# Altium schematic symbol library IC_Maxim.SchLib: 843 symbols (part 3 of 20)
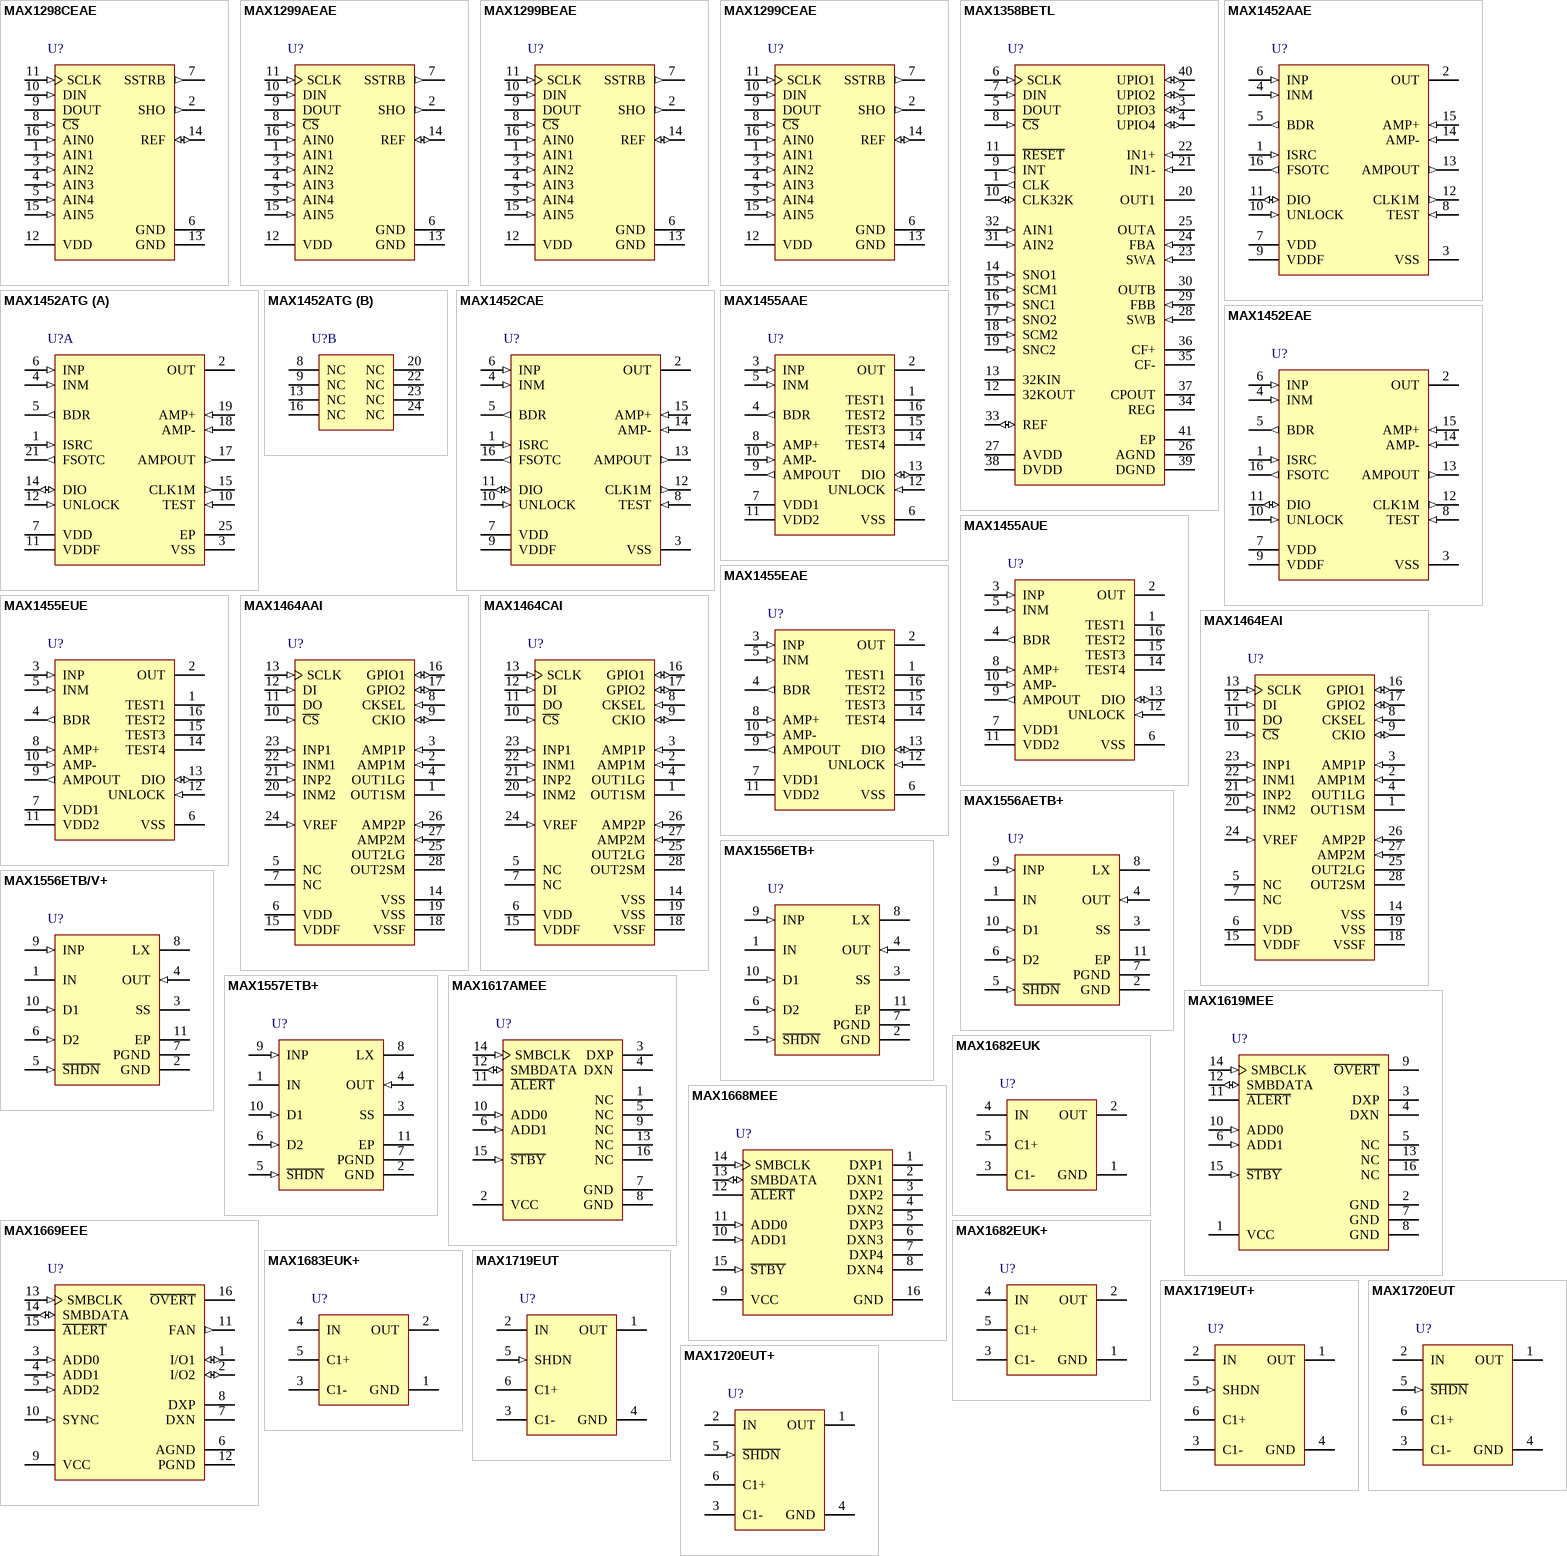
[diagram p26: symbols MAX1298CEAE to MAX1720EUT+]

## MAX1455AAE
designator U?
Low Cost Automotive Sensor Signal Conditioner with 16-bit DAC, -40 to 125 degC, 16-Pin SOP (A16-2); Generic Part Number: MAX1455; PartNumber: MAX1455AAE; Calibration Method: Internal DACs updated from internal EEPROM; Industry Qualified: Automotive - AECQ100, Automotive - General; Output Type: Analog; DatasheetVersion: Rev. 1; PackageVersion: Rev. C, 02/2010; PackageReference: A16-2; PackageDescription: 16-Pin Shrink Small-Outline Package, Body 5.29 x 6.2 mm, Pitch 0.65 mm; Supplier Part Number 1: MAX1455AAE-ND; Supplier Part Number 2: 700-MAX1455AAE-; DACs/ADCs: 16-bit DAC; Features: Aux. Op Amp, No External Trim Req'd ,Temp. Sensor; Mounting Technology: Surface Mount; ComponentLink1Description: Manufacturer URL; ComponentLink1URL: http://www.maximintegrated.com/; ComponentLink2Description: Datasheet; ComponentLink2URL: http://datasheets.maximintegrated.com/en/ds/MAX1455.pdf; ComponentLink3Description: Package Specification; ComponentLink3URL: http://pdfserv.maximintegrated.com/package_dwgs/21-0056.PDF
footprint SSOP16_0.65 (Footprint not found)
pins: 1 TEST1 "Test Pin. Connect to VSS or leave unconnected.", 2 OUT (hiz) "Analog Output. Internal voltage nodes can be accessed in digital mode. OUT can be parallel connected to DIO. Bypass OUT to ground with a 0.1uF capacitor to reduce output noise.", 3 INP (in) "Positive Input. Can be swapped to INM by the Configuration register.", 4 BDR (out) "Bridge Drive Output", 5 INM (in) "Negative Input. Can be swapped to INP by the Configuration register.", 6 VSS (power) "Negative Supply Voltage", 7 VDD1 (power) "Positive Supply Voltage 1. Connect a 0.1uF capacitor from VDD to VSS.", 8 AMP+ (in) "Auxiliary Op Amp Positive Input", 9 AMPOUT (out) "Auxiliary Op Amp Output", 10 AMP- (in) "Auxiliary Op Amp Negative Input", 11 VDD2 (power) "Positive Supply Voltage 2. Connect a 0.47uF capacitor from VDD2 to VSS. Connect VDD2 to VDD1 or for improved noise performance, connect a 1k ohm resistor to VDD1.", 12 UNLOCK (in) "Secure-Lock Disable. There is a 150uA pulldown to VSS. Connect to VDD to disable Secure-Lock and enable serial communication.", 13 DIO (io) "Digital Input Output. Single-pin serial communication port. There are no internal pullups on DIO. Connect pullup resistor from DIO to VDD when in digital mode.", 14 TEST4 "Test Pin. Do not connect.", 15 TEST3 "Test Pin. Connect to VSS or leave unconnected.", 16 TEST2 "Test Pin. Connect to VSS or leave unconnected."

## MAX1455AUE
designator U?
Low Cost Automotive Sensor Signal Conditioner with 16-bit DAC, -40 to 125 degC, 16-Pin SOP (U16-2); Generic Part Number: MAX1455; PartNumber: MAX1455AUE; Calibration Method: Internal DACs updated from internal EEPROM; Industry Qualified: Automotive - AECQ100, Automotive - General; Output Type: Analog; DatasheetVersion: Rev. 1; PackageVersion: Rev. L, 07/2010; PackageReference: U16-2; PackageDescription: 16-Pin Thin Shrink Small-Outline Package, Body 4.4 x 5 mm, Pitch 0.65 mm; Supplier Part Number 1: N/A; DACs/ADCs: 16-bit DAC; Features: Aux. Op Amp, No External Trim Req'd ,Temp. Sensor; Mounting Technology: Surface Mount; Code_JEDEC: MO-153; ComponentLink1Description: Manufacturer URL; ComponentLink1URL: http://www.maximintegrated.com/; ComponentLink2Description: Datasheet; ComponentLink2URL: http://datasheets.maximintegrated.com/en/ds/MAX1455.pdf; ComponentLink3Description: Package Specification; ComponentLink3URL: http://pdfserv.maximintegrated.com/package_dwgs/21-0066.PDF
footprint TSSOP16_0.65 (Footprint not found)
pins: 1 TEST1 "Test Pin. Connect to VSS or leave unconnected.", 2 OUT (hiz) "Analog Output. Internal voltage nodes can be accessed in digital mode. OUT can be parallel connected to DIO. Bypass OUT to ground with a 0.1uF capacitor to reduce output noise.", 3 INP (in) "Positive Input. Can be swapped to INM by the Configuration register.", 4 BDR (out) "Bridge Drive Output", 5 INM (in) "Negative Input. Can be swapped to INP by the Configuration register.", 6 VSS (power) "Negative Supply Voltage", 7 VDD1 (power) "Positive Supply Voltage 1. Connect a 0.1uF capacitor from VDD to VSS.", 8 AMP+ (in) "Auxiliary Op Amp Positive Input", 9 AMPOUT (out) "Auxiliary Op Amp Output", 10 AMP- (in) "Auxiliary Op Amp Negative Input", 11 VDD2 (power) "Positive Supply Voltage 2. Connect a 0.47uF capacitor from VDD2 to VSS. Connect VDD2 to VDD1 or for improved noise performance, connect a 1k ohm resistor to VDD1.", 12 UNLOCK (in) "Secure-Lock Disable. There is a 150uA pulldown to VSS. Connect to VDD to disable Secure-Lock and enable serial communication.", 13 DIO (io) "Digital Input Output. Single-pin serial communication port. There are no internal pullups on DIO. Connect pullup resistor from DIO to VDD when in digital mode.", 14 TEST4 "Test Pin. Do not connect.", 15 TEST3 "Test Pin. Connect to VSS or leave unconnected.", 16 TEST2 "Test Pin. Connect to VSS or leave unconnected."

## MAX1455EAE
designator U?
Low Cost Automotive Sensor Signal Conditioner with 16-bit DAC, -40 to 85 degC, 16-Pin SOP (A16-2); Generic Part Number: MAX1455; PartNumber: MAX1455EAE; Calibration Method: Internal DACs updated from internal EEPROM; Industry Qualified: Automotive - AECQ100, Automotive - General; Output Type: Analog; DatasheetVersion: Rev. 1; PackageVersion: Rev. C, 02/2010; PackageReference: A16-2; PackageDescription: 16-Pin Shrink Small-Outline Package, Body 5.29 x 6.2 mm, Pitch 0.65 mm; Supplier Part Number 1: MAX1455EAE-ND; Supplier Part Number 2: 700-MAX1455EAE-; DACs/ADCs: 16-bit DAC; Features: Aux. Op Amp, No External Trim Req'd ,Temp. Sensor; Mounting Technology: Surface Mount; ComponentLink1Description: Manufacturer URL; ComponentLink1URL: http://www.maximintegrated.com/; ComponentLink2Description: Datasheet; ComponentLink2URL: http://datasheets.maximintegrated.com/en/ds/MAX1455.pdf; ComponentLink3Description: Package Specification; ComponentLink3URL: http://pdfserv.maximintegrated.com/package_dwgs/21-0056.PDF
footprint SSOP16_0.65 (Footprint not found)
pins: 1 TEST1 "Test Pin. Connect to VSS or leave unconnected.", 2 OUT (hiz) "Analog Output. Internal voltage nodes can be accessed in digital mode. OUT can be parallel connected to DIO. Bypass OUT to ground with a 0.1uF capacitor to reduce output noise.", 3 INP (in) "Positive Input. Can be swapped to INM by the Configuration register.", 4 BDR (out) "Bridge Drive Output", 5 INM (in) "Negative Input. Can be swapped to INP by the Configuration register.", 6 VSS (power) "Negative Supply Voltage", 7 VDD1 (power) "Positive Supply Voltage 1. Connect a 0.1uF capacitor from VDD to VSS.", 8 AMP+ (in) "Auxiliary Op Amp Positive Input", 9 AMPOUT (out) "Auxiliary Op Amp Output", 10 AMP- (in) "Auxiliary Op Amp Negative Input", 11 VDD2 (power) "Positive Supply Voltage 2. Connect a 0.47uF capacitor from VDD2 to VSS. Connect VDD2 to VDD1 or for improved noise performance, connect a 1k ohm resistor to VDD1.", 12 UNLOCK (in) "Secure-Lock Disable. There is a 150uA pulldown to VSS. Connect to VDD to disable Secure-Lock and enable serial communication.", 13 DIO (io) "Digital Input Output. Single-pin serial communication port. There are no internal pullups on DIO. Connect pullup resistor from DIO to VDD when in digital mode.", 14 TEST4 "Test Pin. Do not connect.", 15 TEST3 "Test Pin. Connect to VSS or leave unconnected.", 16 TEST2 "Test Pin. Connect to VSS or leave unconnected."

## MAX1455EUE
designator U?
Low Cost Automotive Sensor Signal Conditioner with 16-bit DAC, -40 to 85 degC, 16-Pin SOP (U16-2); Generic Part Number: MAX1455; PartNumber: MAX1455EUE; Calibration Method: Internal DACs updated from internal EEPROM; Industry Qualified: Automotive - AECQ100, Automotive - General; Output Type: Analog; DatasheetVersion: Rev. 1; PackageVersion: Rev. L, 07/2010; PackageReference: U16-2; PackageDescription: 16-Pin Thin Shrink Small-Outline Package, Body 4.4 x 5 mm, Pitch 0.65 mm; Supplier Part Number 1: MAX1455EUE-ND; Supplier Part Number 2: 700-MAX1455EUE-; DACs/ADCs: 16-bit DAC; Features: Aux. Op Amp, No External Trim Req'd ,Temp. Sensor; Mounting Technology: Surface Mount; Code_JEDEC: MO-153; ComponentLink1Description: Manufacturer URL; ComponentLink1URL: http://www.maximintegrated.com/; ComponentLink2Description: Datasheet; ComponentLink2URL: http://datasheets.maximintegrated.com/en/ds/MAX1455.pdf; ComponentLink3Description: Package Specification; ComponentLink3URL: http://pdfserv.maximintegrated.com/package_dwgs/21-0066.PDF
footprint TSSOP16_0.65 (Footprint not found)
pins: 1 TEST1 "Test Pin. Connect to VSS or leave unconnected.", 2 OUT (hiz) "Analog Output. Internal voltage nodes can be accessed in digital mode. OUT can be parallel connected to DIO. Bypass OUT to ground with a 0.1uF capacitor to reduce output noise.", 3 INP (in) "Positive Input. Can be swapped to INM by the Configuration register.", 4 BDR (out) "Bridge Drive Output", 5 INM (in) "Negative Input. Can be swapped to INP by the Configuration register.", 6 VSS (power) "Negative Supply Voltage", 7 VDD1 (power) "Positive Supply Voltage 1. Connect a 0.1uF capacitor from VDD to VSS.", 8 AMP+ (in) "Auxiliary Op Amp Positive Input", 9 AMPOUT (out) "Auxiliary Op Amp Output", 10 AMP- (in) "Auxiliary Op Amp Negative Input", 11 VDD2 (power) "Positive Supply Voltage 2. Connect a 0.47uF capacitor from VDD2 to VSS. Connect VDD2 to VDD1 or for improved noise performance, connect a 1k ohm resistor to VDD1.", 12 UNLOCK (in) "Secure-Lock Disable. There is a 150uA pulldown to VSS. Connect to VDD to disable Secure-Lock and enable serial communication.", 13 DIO (io) "Digital Input Output. Single-pin serial communication port. There are no internal pullups on DIO. Connect pullup resistor from DIO to VDD when in digital mode.", 14 TEST4 "Test Pin. Do not connect.", 15 TEST3 "Test Pin. Connect to VSS or leave unconnected.", 16 TEST2 "Test Pin. Connect to VSS or leave unconnected."

## MAX1464AAI
designator U?
Low-Power, Low-Noise Multichannel Sensor Signal Processor with 16-bit ADC, 16-bit DAC, -40 to 125 degC, 28-Pin SOP (A28-1); Generic Part Number: MAX1464; PartNumber: MAX1464AAI; Calibration Method: Programmable 16-BIT CPU with on-board EEPROM; Industry Qualified: Automotive - AECQ100, Automotive - General; Interface: SPI; Microcontroller/CPU: CPU (16-bit, 4 MHz); Output Type: Analog, Digital ,PMW; DatasheetVersion: Rev. 0; PackageVersion: Rev. C, 02/2010; PackageReference: A28-1; PackageDescription: 28-Pin Shrink Small-Outline Package, Body 5.29 x 10.2 mm, Pitch 0.65 mm; Supplier Part Number 1: N/A; DACs/ADCs: 16-bit ADC, 16-bit DAC; Features: Calibration, Dual Channel ,Linearization and Temp. Compensation ,Low Cost ,Outputs configurable as independent signals ,Prog. Amplification ,Temp. Sensor; Mounting Technology: Surface Mount; Code_JEDEC: MO-150; ComponentLink1Description: Manufacturer URL; ComponentLink1URL: http://www.maximintegrated.com/; ComponentLink2Description: Datasheet; ComponentLink2URL: http://datasheets.maximintegrated.com/en/ds/MAX1464.pdf; ComponentLink3Description: Package Specification; ComponentLink3URL: http://pdfserv.maximintegrated.com/package_dwgs/21-0056.PDF
footprint SSOP28_0.65 (Footprint not found)
pins: 1 OUT1SM (hiz) "Small Op Amp 1 Output", 2 AMP1M (in) "Op Amp 1 Negative Input", 3 AMP1P (in) "Op Amp 1 Positive Input", 4 OUT1LG (hiz) "Large Op Amp 1 Output", 5 NC "No Connection", 6 VDD (power) "Positive Supply Voltage Input. Bypass VDD to VSS with a 0.1uF ceramic capacitor.", 7 NC "No Connection", 8 CKSEL (in) "Clock-Select Digital Input", 9 CKIO (io) "Clock Digital Input/Output", 10 ~{CS} (in) "SPI Chip-Select Digital Input. Active low.", 11 DO (hiz) "SPI Data Output", 12 DI (in) "SPI Data Input", 13 SCLK (in) "SPI Interface Clock", 14 VSS (power) "Negative Power-Supply Input", 15 VDDF (power) "Positive Supply Voltage for FLASH Memory. Bypass VDDF to VSS with a 0.1uF ceramic capacitor.", 16 GPIO1 (io) "General-Purpose Digital Input/Output 1", 17 GPIO2 (io) "General-Purpose Digital Input/Output 2", 18 VSSF (power) "Negative Power-Supply Input for FLASH Memory", 19 VSS (power) "Negative Power-Supply Input", 20 INM2 (in) "Negative Input for ADC Channel 2", 21 INP2 (in) "Positive Input for ADC Channel 2", 22 INM1 (in) "Negative Input for ADC Channel 1", 23 INP1 (in) "Positive Input for ADC Channel 1", 24 VREF (in) "External Reference Voltage Input for ADC and DACs", 25 OUT2LG (hiz) "Large Op Amp 2 Output", 26 AMP2P (in) "Op Amp 2 Positive Input", 27 AMP2M (in) "Op Amp 2 Negative Input", 28 OUT2SM (hiz) "Small Op Amp 2 Output"

## MAX1464CAI
designator U?
Low-Power, Low-Noise Multichannel Sensor Signal Processor with 16-bit ADC, 16-bit DAC, 0 to 70 degC, 28-Pin SOP (A28-1); Generic Part Number: MAX1464; PartNumber: MAX1464CAI; Calibration Method: Programmable 16-BIT CPU with on-board EEPROM; Industry Qualified: Automotive - AECQ100, Automotive - General; Interface: SPI; Microcontroller/CPU: CPU (16-bit, 4 MHz); Output Type: Analog, Digital ,PMW; DatasheetVersion: Rev. 0; PackageVersion: Rev. C, 02/2010; PackageReference: A28-1; PackageDescription: 28-Pin Shrink Small-Outline Package, Body 5.29 x 10.2 mm, Pitch 0.65 mm; Supplier Part Number 1: N/A; DACs/ADCs: 16-bit ADC, 16-bit DAC; Features: Calibration, Dual Channel ,Linearization and Temp. Compensation ,Low Cost ,Outputs configurable as independent signals ,Prog. Amplification ,Temp. Sensor; Mounting Technology: Surface Mount; Code_JEDEC: MO-150; ComponentLink1Description: Manufacturer URL; ComponentLink1URL: http://www.maximintegrated.com/; ComponentLink2Description: Datasheet; ComponentLink2URL: http://datasheets.maximintegrated.com/en/ds/MAX1464.pdf; ComponentLink3Description: Package Specification; ComponentLink3URL: http://pdfserv.maximintegrated.com/package_dwgs/21-0056.PDF
footprint SSOP28_0.65 (Footprint not found)
pins: 1 OUT1SM (hiz) "Small Op Amp 1 Output", 2 AMP1M (in) "Op Amp 1 Negative Input", 3 AMP1P (in) "Op Amp 1 Positive Input", 4 OUT1LG (hiz) "Large Op Amp 1 Output", 5 NC "No Connection", 6 VDD (power) "Positive Supply Voltage Input. Bypass VDD to VSS with a 0.1uF ceramic capacitor.", 7 NC "No Connection", 8 CKSEL (in) "Clock-Select Digital Input", 9 CKIO (io) "Clock Digital Input/Output", 10 ~{CS} (in) "SPI Chip-Select Digital Input. Active low.", 11 DO (hiz) "SPI Data Output", 12 DI (in) "SPI Data Input", 13 SCLK (in) "SPI Interface Clock", 14 VSS (power) "Negative Power-Supply Input", 15 VDDF (power) "Positive Supply Voltage for FLASH Memory. Bypass VDDF to VSS with a 0.1uF ceramic capacitor.", 16 GPIO1 (io) "General-Purpose Digital Input/Output 1", 17 GPIO2 (io) "General-Purpose Digital Input/Output 2", 18 VSSF (power) "Negative Power-Supply Input for FLASH Memory", 19 VSS (power) "Negative Power-Supply Input", 20 INM2 (in) "Negative Input for ADC Channel 2", 21 INP2 (in) "Positive Input for ADC Channel 2", 22 INM1 (in) "Negative Input for ADC Channel 1", 23 INP1 (in) "Positive Input for ADC Channel 1", 24 VREF (in) "External Reference Voltage Input for ADC and DACs", 25 OUT2LG (hiz) "Large Op Amp 2 Output", 26 AMP2P (in) "Op Amp 2 Positive Input", 27 AMP2M (in) "Op Amp 2 Negative Input", 28 OUT2SM (hiz) "Small Op Amp 2 Output"

## MAX1464EAI
designator U?
Low-Power, Low-Noise Multichannel Sensor Signal Processor with 16-bit ADC, 16-bit DAC, -40 to 85 degC, 28-Pin SOP (A28-1); Generic Part Number: MAX1464; PartNumber: MAX1464EAI; Calibration Method: Programmable 16-BIT CPU with on-board EEPROM; Industry Qualified: Automotive - AECQ100, Automotive - General; Interface: SPI; Microcontroller/CPU: CPU (16-bit, 4 MHz); Output Type: Analog, Digital ,PMW; DatasheetVersion: Rev. 0; PackageVersion: Rev. C, 02/2010; PackageReference: A28-1; PackageDescription: 28-Pin Shrink Small-Outline Package, Body 5.29 x 10.2 mm, Pitch 0.65 mm; Supplier Part Number 1: N/A; DACs/ADCs: 16-bit ADC, 16-bit DAC; Features: Calibration, Dual Channel ,Linearization and Temp. Compensation ,Low Cost ,Outputs configurable as independent signals ,Prog. Amplification ,Temp. Sensor; Mounting Technology: Surface Mount; Code_JEDEC: MO-150; ComponentLink1Description: Manufacturer URL; ComponentLink1URL: http://www.maximintegrated.com/; ComponentLink2Description: Datasheet; ComponentLink2URL: http://datasheets.maximintegrated.com/en/ds/MAX1464.pdf; ComponentLink3Description: Package Specification; ComponentLink3URL: http://pdfserv.maximintegrated.com/package_dwgs/21-0056.PDF
footprint SSOP28_0.65 (Footprint not found)
pins: 1 OUT1SM (hiz) "Small Op Amp 1 Output", 2 AMP1M (in) "Op Amp 1 Negative Input", 3 AMP1P (in) "Op Amp 1 Positive Input", 4 OUT1LG (hiz) "Large Op Amp 1 Output", 5 NC "No Connection", 6 VDD (power) "Positive Supply Voltage Input. Bypass VDD to VSS with a 0.1uF ceramic capacitor.", 7 NC "No Connection", 8 CKSEL (in) "Clock-Select Digital Input", 9 CKIO (io) "Clock Digital Input/Output", 10 ~{CS} (in) "SPI Chip-Select Digital Input. Active low.", 11 DO (hiz) "SPI Data Output", 12 DI (in) "SPI Data Input", 13 SCLK (in) "SPI Interface Clock", 14 VSS (power) "Negative Power-Supply Input", 15 VDDF (power) "Positive Supply Voltage for FLASH Memory. Bypass VDDF to VSS with a 0.1uF ceramic capacitor.", 16 GPIO1 (io) "General-Purpose Digital Input/Output 1", 17 GPIO2 (io) "General-Purpose Digital Input/Output 2", 18 VSSF (power) "Negative Power-Supply Input for FLASH Memory", 19 VSS (power) "Negative Power-Supply Input", 20 INM2 (in) "Negative Input for ADC Channel 2", 21 INP2 (in) "Positive Input for ADC Channel 2", 22 INM1 (in) "Negative Input for ADC Channel 1", 23 INP1 (in) "Positive Input for ADC Channel 1", 24 VREF (in) "External Reference Voltage Input for ADC and DACs", 25 OUT2LG (hiz) "Large Op Amp 2 Output", 26 AMP2P (in) "Op Amp 2 Positive Input", 27 AMP2M (in) "Op Amp 2 Negative Input", 28 OUT2SM (hiz) "Small Op Amp 2 Output"

## MAX1556AETB+
designator U?
16uA IQ, 1.2A PWM Step-Down DC-DC Converter, 1.8V; 2.5V; 3.3V output, 10-Pin TDFN-EP, -40癈 to +85癈, Pb-Free; DatasheetVersion: Rev 3, Jan-2011; PackageVersion: revJ, 2009; PackageReference: T1033+1; PackageDescription: 10-Pin Plastic Very Very Thin Dual Flatpack No Leads, Exposed Pad, 3 x 3 x 0.8 mm Body, TDFN-EP, Pb-Free; Code_JEDEC: MO-229-WEED-3; ComponentLink1Description: Manufacturer URL; ComponentLink1URL: http://www.maxim-ic.com; ComponentLink2Description: Datasheet; ComponentLink2URL: http://datasheets.maxim-ic.com/en/ds/MAX1556-MAX1557.pdf; ComponentLink3Description: Package Specification; ComponentLink3URL: http://pdfserv.maxim-ic.com/package_dwgs/21-0137.PDF
footprint DFN10_0.5-PAD(3X3) (Footprint not found)
pins: 1 IN (power), 2 GND (power), 3 SS, 4 OUT (in), 5 ~{SHDN} (in), 6 D2 (in), 7 PGND (power), 8 LX, 9 INP (in), 10 D1 (in), 11 EP (power)

## MAX1556ETB+
designator U?
16uA IQ, 1.2A PWM Step-Down DC-DC Converter, 1.8V; 2.5V; 3.3V output, 10-Pin TDFN-EP, -40癈 to +85癈, Pb-Free; DatasheetVersion: Rev 3, Jan-2011; PackageVersion: revJ, 2009; PackageReference: T1033+1; PackageDescription: 10-Pin Plastic Very Very Thin Dual Flatpack No Leads, Exposed Pad, 3 x 3 x 0.8 mm Body, TDFN-EP, Pb-Free; Code_JEDEC: MO-229-WEED-3; ComponentLink1Description: Manufacturer URL; ComponentLink1URL: http://www.maxim-ic.com; ComponentLink2Description: Datasheet; ComponentLink2URL: http://datasheets.maxim-ic.com/en/ds/MAX1556-MAX1557.pdf; ComponentLink3Description: Package Specification; ComponentLink3URL: http://pdfserv.maxim-ic.com/package_dwgs/21-0137.PDF
footprint DFN10_0.5-PAD(3X3) (Footprint not found)
pins: 1 IN (power), 2 GND (power), 3 SS, 4 OUT (in), 5 ~{SHDN} (in), 6 D2 (in), 7 PGND (power), 8 LX, 9 INP (in), 10 D1 (in), 11 EP (power)

## MAX1556ETB/V+
designator U?
16uA IQ, 1.2A PWM Step-Down DC-DC Converter, 1.8V; 2.5V; 3.3V output, 10-Pin TDFN-EP, -40癈 to +85癈, Pb-Free; DatasheetVersion: Rev 3, Jan-2011; PackageVersion: revJ, 2009; PackageReference: T1033+1; PackageDescription: 10-Pin Plastic Very Very Thin Dual Flatpack No Leads, Exposed Pad, 3 x 3 x 0.8 mm Body, TDFN-EP, Pb-Free; Code_JEDEC: MO-229-WEED-3; ComponentLink1Description: Manufacturer URL; ComponentLink1URL: http://www.maxim-ic.com; ComponentLink2Description: Datasheet; ComponentLink2URL: http://datasheets.maxim-ic.com/en/ds/MAX1556-MAX1557.pdf; ComponentLink3Description: Package Specification; ComponentLink3URL: http://pdfserv.maxim-ic.com/package_dwgs/21-0137.PDF
footprint DFN10_0.5-PAD(3X3) (Footprint not found)
pins: 1 IN (power), 2 GND (power), 3 SS, 4 OUT (in), 5 ~{SHDN} (in), 6 D2 (in), 7 PGND (power), 8 LX, 9 INP (in), 10 D1 (in), 11 EP (power)

## MAX1557ETB+
designator U?
16uA IQ, 1.2A PWM Step-Down DC-DC Converter, 1V; 1.3V; 1.5V output, 10-Pin TDFN-EP, -40癈 to +85癈, Pb-Free; DatasheetVersion: Rev 3, Jan-2011; PackageVersion: revJ, 2009; PackageReference: T1033+1; PackageDescription: 10-Pin Plastic Very Very Thin Dual Flatpack No Leads, Exposed Pad, 3 x 3 x 0.8 mm Body, TDFN-EP, Pb-Free; Code_JEDEC: MO-229-WEED-3; ComponentLink1Description: Manufacturer URL; ComponentLink1URL: http://www.maxim-ic.com; ComponentLink2Description: Datasheet; ComponentLink2URL: http://datasheets.maxim-ic.com/en/ds/MAX1556-MAX1557.pdf; ComponentLink3Description: Package Specification; ComponentLink3URL: http://pdfserv.maxim-ic.com/package_dwgs/21-0137.PDF
footprint DFN10_0.5-PAD(3X3) (Footprint not found)
pins: 1 IN (power), 2 GND (power), 3 SS, 4 OUT (in), 5 ~{SHDN} (in), 6 D2 (in), 7 PGND (power), 8 LX, 9 INP (in), 10 D1 (in), 11 EP (power)

## MAX1617AMEE
designator U?
Remote / Local Temperature Sensor with SMBus Serial Interface, 8 Bits Temperature Resolution, -55 to 125 degC, 16-Pin SOP (E16-1); Generic Part Number: MAX1617A; PartNumber: MAX1617AMEE; Alarm Output: Alert; Functions: Remote & Local Sensor; Interface: 2-Wire/I2C/SMBus; Parasite Pwr.: No; DatasheetVersion: Rev. 1; PackageVersion: Rev. K, 04/2012; PackageReference: E16-1; PackageDescription: 16-Pin Quarter Small-Outline Package (E16-1), Body 4.90 x 3.89 mm, Pitch 0.635 mm; Supplier Part Number 1: MAX1617AMEE-ND; Supplier Part Number 2: N/A; Mounting Technology: Surface Mount; Code_JEDEC: MO137; ComponentLink1Description: Manufacturer URL; ComponentLink1URL: http://www.maximintegrated.com/; ComponentLink2Description: Datasheet; ComponentLink2URL: http://datasheets.maximintegrated.com/en/ds/MAX1617A.pdf; ComponentLink3Description: Package Specification; ComponentLink3URL: http://pdfserv.maximintegrated.com/package_dwgs/21-0055.PDF
footprint SSOP16_0.635 (Footprint not found)
pins: 1 NC "No Connection. Not internally connected. May be used for PC board trace routing.", 2 VCC (power) "Supply Voltage Input. +3.0V to +5.5V. Bypass to GND with a 0.1uF capacitor. A 200ohm series resistor is recommended but not required for additional noise filtering.", 3 DXP "Combined Current Source and ADC Positive Input for Remote-Junction Channel. If a remotesensing junction is not used, connect DXP to DXN.", 4 DXN "Combined Current Sink and ADC Negative Input. DXN is internally biased to a diode voltage above ground.", 5 NC "No Connection. Not internally connected. May be used for PC board trace routing.", 6 ADD1 (in) "SMBus Slave Address Select Input. ADD0 and ADD1 are sampled upon power-up.", 7 GND (power) "Ground", 8 GND (power) "Ground", 9 NC "No Connection. Not internally connected. May be used for PC board trace routing.", 10 ADD0 (in) "SMBus Slave Address Select Input. ADD0 and ADD1 are sampled upon power-up.", 11 ~{ALERT} (oc) "SMBus Alert (Interrupt) Output. Open drain.", 12 SMBDATA (io) "SMBus Serial-Data Input/Output. Open drain.", 13 NC "No Connection. Not internally connected. May be used for PC board trace routing.", 14 SMBCLK (in) "SMBus Serial-Clock Input", 15 ~{STBY} (in) "Hardware Standby Input. Temperature and comparison threshold data are retained in standby mode. Low = standby mode, high = operating mode.", 16 NC "No Connection. Not internally connected. May be used for PC board trace routing."

## MAX1619MEE
designator U?
Remote / Local Temperature Sensor with Dual-Alarm Outputs and SMBus Serial Interface, 8 Bits Temperature Resolution, -55 to 125 degC, 16-Pin SOP (E16-5); Generic Part Number: MAX1619; PartNumber: MAX1619MEE; Alarm Output: Alert, Overt; Functions: Remote & Local Sensor; Interface: 2-Wire/I2C/SMBus; Parasite Pwr.: No; DatasheetVersion: Rev. 0; PackageVersion: Rev. K, 04/2012; PackageReference: E16-5; PackageDescription: 16-Pin Quarter Small-Outline Package, Body 3.9 x 4.89 mm, Pitch 0.635 mm; Supplier Part Number 1: MAX1619MEE-ND; Supplier Part Number 2: N/A; Mounting Technology: Surface Mount; Code_JEDEC: MO-137; ComponentLink1Description: Manufacturer URL; ComponentLink1URL: http://www.maximintegrated.com/; ComponentLink2Description: Datasheet; ComponentLink2URL: http://datasheets.maximintegrated.com/en/ds/MAX1619.pdf; ComponentLink3Description: Package Specification; ComponentLink3URL: http://pdfserv.maximintegrated.com/package_dwgs/21-0055.PDF
footprint SSOP16_0.635 (Footprint not found)
pins: 1 VCC (power) "Supply Voltage Input, 3V to 5.5V. Bypass to GND with a 0.1uF capacitor. A 200Ohm series resistor is recommended but not required for additional noise filtering.", 2 GND (power) "Not internally connected. Connect to GND to act against leakage paths from VCC to DXP.", 3 DXP "Combined Current Source and A/D Positive Input for Remote-Diode Channel. Do not leave DXP floating; connect DXP to DXN if no remote diode is used. Place a 2200pF capacitor between DXP and DXN for noise filtering.", 4 DXN "Combined Current Sink and A/D Negative Input. DXN is normally internally biased to a diode voltage above ground.", 5 NC "No Connection. Not internally connected. May be used for PC board trace routing.", 6 ADD1 (in) "SMBus Address Select Pin (Table 8). ADD0 and ADD1 are sampled upon power-up. Excess capacitance (>50pF) at the address pins when floating may cause address-recognition problems.", 7 GND (power) "Ground", 8 GND (power) "Ground", 9 ~{OVERT} (oc) "Overtemperature Alarm Output, Open Drain. This is an unlatched alarm output that responds only to the remote diode temperature.", 10 ADD0 (in) "SMBus Slave Address Select Pin", 11 ~{ALERT} (oc) "SMBus Alert (interrupt) Output, Open Drain", 12 SMBDATA (io) "SMBus Serial-Data Input/Output, Open Drain", 13 NC "No Connection. Not internally connected. May be used for PC board trace routing.", 14 SMBCLK (in) "SMBus Serial-Clock Input", 15 ~{STBY} (in) "Hardware Standby Input. Temperature and comparison threshold data are retained in standby mode.Low = standby mode, high = operate mode.", 16 NC "No Connection. Not internally connected. May be used for PC board trace routing."

## MAX1668MEE
designator U?
Five-Channel Temperature Sensor with SMBus Serial Interface, 8 Bits Temperature Resolution, -55 to 125 degC, 16-Pin SOP (E16-1); Generic Part Number: MAX1668; PartNumber: MAX1668MEE; Alarm Output: Alert; Functions: Remote & Local Sensor; Interface: 2-Wire/I2C/SMBus; Parasite Pwr.: No; DatasheetVersion: Rev. 2; PackageVersion: Rev. K, 04/2012; PackageReference: E16-1; PackageDescription: 16-Pin Quarter Small-Outline Package (E16-1), Body 4.90 x 3.89 mm, Pitch 0.635 mm; Supplier Part Number 1: MAX1668MEE-ND; Supplier Part Number 2: N/A; Mounting Technology: Surface Mount; Code_JEDEC: MO137; ComponentLink1Description: Manufacturer URL; ComponentLink1URL: http://www.maximintegrated.com/; ComponentLink2Description: Datasheet; ComponentLink2URL: http://datasheets.maximintegrated.com/en/ds/MAX1668-MAX1989.pdf; ComponentLink3Description: Package Specification; ComponentLink3URL: http://pdfserv.maximintegrated.com/package_dwgs/21-0055.PDF
footprint SSOP16_0.635 (Footprint not found)
pins: 1 DXP1 "Combined Current Source and A/D Positive Input for Remote-Diode Channel. Do not leave DXP floating; connect DXP to DXN if no remote diode is used. Place a 2200pF capacitor between DXP and DXN for noise filtering.", 2 DXN1 "Combined Current Sink and A/D Negative Input. DXN is normally biased to a diode voltage above ground.", 3 DXP2 "Combined Current Source and A/D Positive Input for Remote-Diode Channel. Do not leave DXP floating; connect DXP to DXN if no remote diode is used. Place a 2200pF capacitor between DXP and DXN for noise filtering.", 4 DXN2 "Combined Current Sink and A/D Negative Input. DXN is normally biased to a diode voltage above ground.", 5 DXP3 "Combined Current Source and A/D Positive Input for Remote-Diode Channel. Do not leave DXP floating; connect DXP to DXN if no remote diode is used. Place a 2200pF capacitor between DXP and DXN for noise filtering.", 6 DXN3 "Combined Current Sink and A/D Negative Input. DXN is normally biased to a diode voltage above ground.", 7 DXP4 "Combined Current Source and A/D Positive Input for Remote-Diode Channel. Do not leave DXP floating; connect DXP to DXN if no remote diode is used. Place a 2200pF capacitor between DXP and DXN for noise filtering.", 8 DXN4 "Combined Current Sink and A/D Negative Input. DXN is normally biased to a diode voltage above ground.", 9 VCC (power) "Supply Voltage Input, 3V to 5.5V. Bypass to GND with a 0.1礔 capacitor. A 200ohm series resistor is recommended but not required for additional noise filtering.", 10 ADD1 (in) "SMBus Address Select Pin (Table 8). ADD0 and ADD1 are sampled upon power-up. Excess capacitance (>50pF) at the address pins when floating can cause addressrecognition problems.", 11 ADD0 (in) "SMBus Slave Address Select Pin", 12 ~{ALERT} (oc) "SMBus Alert (Interrupt) Output, Open Drain", 13 SMBDATA (io) "SMBus Serial-Data Input/Output, Open Drain", 14 SMBCLK (in) "SMBus Serial-Clock Input", 15 ~{STBY} (in) "Hardware Standby Input. Temperature and comparison threshold data are retained in standby mode. Low = standby mode, high = operate mode.", 16 GND (power) "Ground"

## MAX1669EEE
designator U?
Remote Temperature Sensor and Fan Controller with SMBus Serial Interface, 8 Bits Tempearture Resolution, -40 to 85 degC, 16-Pin SOP (E16-1); Generic Part Number: MAX1669; PartNumber: MAX1669EEE; Fan Cntrl.: PWM; Interface: 2-Wire/I2C/SMBus; DatasheetVersion: Rev. 0; PackageVersion: Rev. K, 04/2012; PackageReference: E16-1; PackageDescription: 16-Pin Quarter Small-Outline Package (E16-1), Body 4.90 x 3.89 mm, Pitch 0.635 mm; Supplier Part Number 1: N/A; Mounting Technology: Surface Mount; Code_JEDEC: MO137; ComponentLink1Description: Manufacturer URL; ComponentLink1URL: http://www.maximintegrated.com/; ComponentLink2Description: Datasheet; ComponentLink2URL: http://datasheets.maximintegrated.com/en/ds/MAX1669.pdf; ComponentLink3Description: Package Specification; ComponentLink3URL: http://pdfserv.maximintegrated.com/package_dwgs/21-0055.PDF
footprint SSOP16_0.635 (Footprint not found)
pins: 1 I/O1 (io) "General-Purpose Open-Drain Logic Input/Output 1. I/O1 is intended for driving LEDs, driving power-plane switching MOSFETs, or detecting fan presence or chassis intrusion.", 2 I/O2 (io) "General-Purpose Open-Drain Logic Input/Output 2. I/O2 is intended for driving LEDs, driving power-plane switching MOSFETs, or detecting fan presence or chassis intrusion.", 3 ADD0 (in) "SMBus Address Select Pin 0.", 4 ADD1 (in) "SMBus Address Select Pin 1.", 5 ADD2 (in) "SMBus Address Select Pin 2.", 6 AGND (power) "Analog Ground", 7 DXN "Combined Current Sink and ADC Negative Input from Remote Diode. DXN is normally biased to a diode voltage above ground.", 8 DXP "Combined Current Source and ADC Positive Input from Remote Diode. Place a 2200pF capacitor between DXP and DXN for noise filtering.", 9 VCC (power) "Supply Voltage Input, +3V to +5.5V. Bypass to AGND with a 0.1uF capacitor.", 10 SYNC (in) "Oscillator Synchronization Input. Connect to AGND to use internal clock. Capture range is 140kHz to 400kHz. The synchronization signal is internally applied to the FAN PWM clock. See Table 5 for synchronized frequencies.", 11 FAN (out) "Fan-Control Logic Output. Swings from PGND to VCC in PWM mode, or PGND to 0.94 ?VCC in DAC mode.", 12 PGND (power) "Power Ground", 13 SMBCLK (in) "SMBus Serial-Clock Input", 14 SMBDATA (io) "Open-Drain SMBus Serial-Data Input/Output", 15 ~{ALERT} (hiz) "Active-Low, Open-Drain SMBus Alert (interrupt) Output", 16 ~{OVERT} (hiz) "Active-Low, Open-Drain Thermostat Output. Activated by TCRIT threshold"

## MAX1682EUK
designator U?
Switched-Capacitor Voltage Doubler, 12kHz Oscillator, 5-Pin SOT, -40癈 to +85癈; DatasheetVersion: Rev 3, Nov-2010; PackageVersion: revF, 2006; PackageReference: U5-2; PackageDescription: 5-Pin Small-Outline Transistor Package, 0.95 mm Pitch, 2.8 mm Lead Span, SOT-23; Code_JEDEC: MO-178AA; ComponentLink1Description: Manufacturer URL; ComponentLink1URL: http://www.maxim-ic.com; ComponentLink2Description: Datasheet; ComponentLink2URL: http://datasheets.maxim-ic.com/en/ds/MAX1682-MAX1683.pdf; ComponentLink3Description: Package Specification; ComponentLink3URL: http://pdfserv.maxim-ic.com/package_dwgs/21-0057.PDF
footprint SOT23-5 (Footprint not found)
pins: 1 GND (power), 2 OUT (power), 3 C1-, 4 IN (power), 5 C1+

## MAX1682EUK+
designator U?
Switched-Capacitor Voltage Doubler, 12kHz Oscillator, 5-Pin SOT, -40癈 to +85癈, Pb-Free; DatasheetVersion: Rev 3, Nov-2010; PackageVersion: revF, 2006; PackageReference: U5+2; PackageDescription: 5-Pin Small-Outline Transistor Package, 0.95 mm Pitch, 2.8 mm Lead Span, SOT-23, Pb-Free; Code_JEDEC: MO-178AA; ComponentLink1Description: Manufacturer URL; ComponentLink1URL: http://www.maxim-ic.com; ComponentLink2Description: Datasheet; ComponentLink2URL: http://datasheets.maxim-ic.com/en/ds/MAX1682-MAX1683.pdf; ComponentLink3Description: Package Specification; ComponentLink3URL: http://pdfserv.maxim-ic.com/package_dwgs/21-0057.PDF
footprint SOT23-5 (Footprint not found)
pins: 1 GND (power), 2 OUT (power), 3 C1-, 4 IN (power), 5 C1+

## MAX1683EUK+
designator U?
Switched-Capacitor Voltage Doubler, 35kHz Oscillator, 5-Pin SOT, -40癈 to +85癈, Pb-Free; DatasheetVersion: Rev 3, Nov-2010; PackageVersion: revF, 2006; PackageReference: U5+2; PackageDescription: 5-Pin Small-Outline Transistor Package, 0.95 mm Pitch, 2.8 mm Lead Span, SOT-23, Pb-Free; Code_JEDEC: MO-178AA; ComponentLink1Description: Manufacturer URL; ComponentLink1URL: http://www.maxim-ic.com; ComponentLink2Description: Datasheet; ComponentLink2URL: http://datasheets.maxim-ic.com/en/ds/MAX1682-MAX1683.pdf; ComponentLink3Description: Package Specification; ComponentLink3URL: http://pdfserv.maxim-ic.com/package_dwgs/21-0057.PDF
footprint SOT23-5 (Footprint not found)
pins: 1 GND (power), 2 OUT (power), 3 C1-, 4 IN (power), 5 C1+

## MAX1719EUT
designator U?
Switched-Capacitor Voltage Inverter with Shutdown, 125kHz, 6-Pin SOT, -40癈 to +85癈; DatasheetVersion: Rev 2, Apr-2004; PackageVersion: revL, 2011; PackageReference: U6-4; PackageDescription: 6-Pin SOT-23 Package, 0.65 mm Pitch, 2.2 mm Lead Span; Code_JEDEC: MO-178-AB; ComponentLink1Description: Manufacturer URL; ComponentLink1URL: http://www.maxim-ic.com; ComponentLink2Description: Datasheet; ComponentLink2URL: http://datasheets.maxim-ic.com/en/ds/MAX1719-MAX1721.pdf; ComponentLink3Description: Package Specification; ComponentLink3URL: http://pdfserv.maxim-ic.com/package_dwgs/21-0058.PDF
footprint SOT23-6 (Footprint not found)
pins: 1 OUT (power), 2 IN (power), 3 C1-, 4 GND (power), 5 SHDN (in), 6 C1+

## MAX1719EUT+
designator U?
Switched-Capacitor Voltage Inverter with Shutdown, 125kHz, 6-Pin SOT, -40癈 to +85癈, Pb-Free; DatasheetVersion: Rev 2, Apr-2004; PackageVersion: revL, 2011; PackageReference: U6+4; PackageDescription: 6-Pin SOT-23 Package, 0.65 mm Pitch, 2.2 mm Lead Span, Pb-Free; Code_JEDEC: MO-178-AB; ComponentLink1Description: Manufacturer URL; ComponentLink1URL: http://www.maxim-ic.com; ComponentLink2Description: Datasheet; ComponentLink2URL: http://datasheets.maxim-ic.com/en/ds/MAX1719-MAX1721.pdf; ComponentLink3Description: Package Specification; ComponentLink3URL: http://pdfserv.maxim-ic.com/package_dwgs/21-0058.PDF
footprint SOT23-6 (Footprint not found)
pins: 1 OUT (power), 2 IN (power), 3 C1-, 4 GND (power), 5 SHDN (in), 6 C1+

## MAX1720EUT
designator U?
Switched-Capacitor Voltage Inverter with Shutdown, 12kHz, 6-Pin SOT, -40癈 to +85癈; DatasheetVersion: Rev 2, Apr-2004; PackageVersion: revL, 2011; PackageReference: U6-4; PackageDescription: 6-Pin SOT-23 Package, 0.65 mm Pitch, 2.2 mm Lead Span; Code_JEDEC: MO-178-AB; ComponentLink1Description: Manufacturer URL; ComponentLink1URL: http://www.maxim-ic.com; ComponentLink2Description: Datasheet; ComponentLink2URL: http://datasheets.maxim-ic.com/en/ds/MAX1719-MAX1721.pdf; ComponentLink3Description: Package Specification; ComponentLink3URL: http://pdfserv.maxim-ic.com/package_dwgs/21-0058.PDF
footprint SOT23-6 (Footprint not found)
pins: 1 OUT (power), 2 IN (power), 3 C1-, 4 GND (power), 5 ~{SHDN} (in), 6 C1+

## MAX1720EUT+
designator U?
Switched-Capacitor Voltage Inverter with Shutdown, 12kHz, 6-Pin SOT, -40癈 to +85癈, Pb-Free; DatasheetVersion: Rev 2, Apr-2004; PackageVersion: revL, 2011; PackageReference: U6+4; PackageDescription: 6-Pin SOT-23 Package, 0.65 mm Pitch, 2.2 mm Lead Span, Pb-Free; Code_JEDEC: MO-178-AB; ComponentLink1Description: Manufacturer URL; ComponentLink1URL: http://www.maxim-ic.com; ComponentLink2Description: Datasheet; ComponentLink2URL: http://datasheets.maxim-ic.com/en/ds/MAX1719-MAX1721.pdf; ComponentLink3Description: Package Specification; ComponentLink3URL: http://pdfserv.maxim-ic.com/package_dwgs/21-0058.PDF
footprint SOT23-6 (Footprint not found)
pins: 1 OUT (power), 2 IN (power), 3 C1-, 4 GND (power), 5 ~{SHDN} (in), 6 C1+
